# Altium footprint library ThanhNT.PcbLib: 579 footprints (part 6 of 37)
Each footprint in its own frame and in the unit in brackets; x right, y up, seen from the top. Pads: shape width x height; smd on the part's side, far side on the other; paste and mask are expansions set on the pad; w line width, h text height; cw(c..) or ccw(c..) is an arc to the next point about the centre after c.
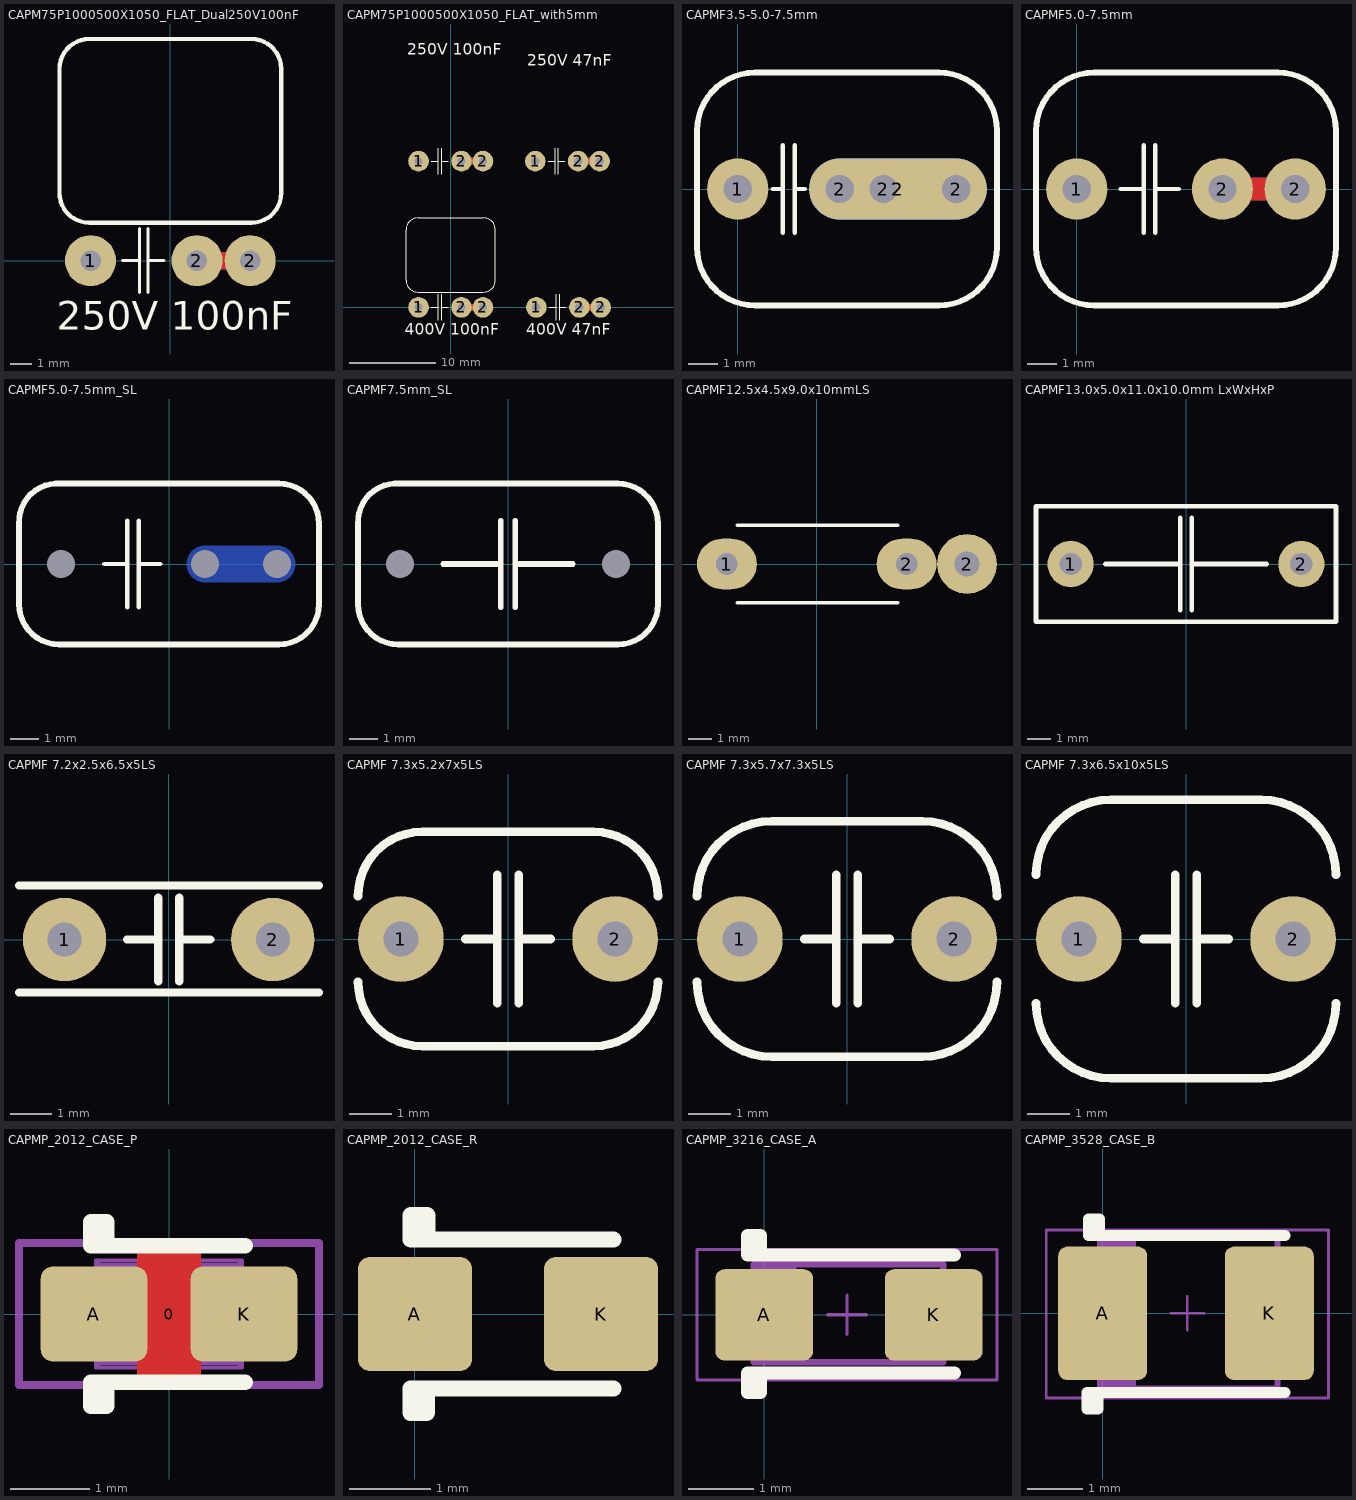
[diagram p5: the footprints below, top view; thin cyan lines are the x and y axes]

## CAPM75P1000500X1050_FLAT_Dual250V100nF [mm] "Capacitor, THT, Metallized Polyester Film with 3.5x9.5x10.0mm TxHxW"
height 3.5
pads (3):
  round 2.4 hole 0.965: 1(-3.75,0) 2(1.25,0) 2(3.75,0)
Top Layer:
  lines w0.813: 1.25,0 3.75,0
Bottom Layer:
  lines w0.813: 1.25,0 3.75,0
Top Overlay:
  lines w0.15: -2.25,0 -1.45,0 ; -1.45,-1.5 -1.45,1.5 ; -1.05,-1.5 -1.05,1.5 ; -1.05,0 -0.3,0
  lines w0.2: -5.207,3.175 ccw(c-3.81,3.175) -3.81,1.778 3.81,1.778 ccw(c3.81,3.175) 5.207,3.175 5.207,9.017 ccw(c3.81,9.017) 3.81,10.414 -3.81,10.414 ccw(c-3.81,9.017) -5.207,9.017 -5.207,3.175
  text "250V 100nF" at -5.334,-3.683 h2.29
3D body "CAPMUC75P900420X810_FLAT.STEP": height 4.2, standoff -1.78, extent -4.5,-0.249 4.5,9.6
3D body "CAPMUC50P650570X860_FLAT.STEP": height 5.7, standoff -1.78, extent -4.5,-0.249 2,10.1
3D body "CAPM50P760540X1040_FLAT.STEP": height 5.4, standoff -1.78, extent -5.05,-0.249 2.55,11.5
3D body "CAPM50P730450X950_FLAT.STEP": height 4.5, standoff -1.78, extent -4.9,-0.249 2.4,10.6
3D body "CAPM75P1000400X850_FLAT.STEP": height 4, standoff -1.78, extent -5,-0.249 5,9.6

## CAPM75P1000500X1050_FLAT_with5mm [mm] "Capacitor, THT, Metallized Polyester Film with 3.5x9.5x10.0mm TxHxW"
height 3.5
pads (12):
  round 2.4 hole 0.965: 1(-3.75,0) 1(-3.75,17.018) 1(9.839,17.018) 1(9.966,0) 2(1.25,0) 2(1.25,17.018) 2(3.75,0) 2(3.75,17.018) 2(14.839,17.018) 2(14.966,0) 2(17.339,17.018) 2(17.466,0)
Top Layer:
  lines w0.813: 1.25,0 3.75,0 ; 1.25,17.018 3.75,17.018 ; 14.839,17.018 17.339,17.018 ; 14.966,0 17.466,0
Bottom Layer:
  lines w0.813: 1.25,0 3.75,0 ; 1.25,17.018 3.75,17.018 ; 14.839,17.018 17.339,17.018 ; 14.966,0 17.466,0
Top Overlay:
  lines w0.127: -2.25,0 -1.45,0 ; -2.25,17.018 -1.45,17.018 ; -1.45,-1.5 -1.45,1.5 ; -1.45,15.518 -1.45,18.518 ; -1.05,-1.5 -1.05,1.5 ; -1.05,0 -0.3,0 ; -1.05,15.518 -1.05,18.518 ; -1.05,17.018 -0.3,17.018 ; 11.339,17.018 12.139,17.018 ; 11.466,0 12.266,0 ; 12.139,15.518 12.139,18.518 ; 12.266,-1.5 12.266,1.5 ; 12.539,15.518 12.539,18.518 ; 12.539,17.018 13.289,17.018 ; 12.666,-1.5 12.666,1.5 ; 12.666,0 13.416,0 ; -5.207,3.175 ccw(c-3.81,3.175) -3.81,1.778 3.81,1.778 ccw(c3.81,3.175) 5.207,3.175 5.207,9.017 ccw(c3.81,9.017) 3.81,10.414 -3.81,10.414 ccw(c-3.81,9.017) -5.207,9.017 -5.207,3.175
  text "400V 100nF" at -5.334,-3.683 h2.29
  text "400V 47nF" at 8.763,-3.683 h2.29
  text "250V 100nF" at -5.08,28.956 h2.29
  text "250V 47nF" at 8.89,27.686 h2.29
3D body "CAPM75P1000400X850_FLAT.STEP": height 4, standoff -1.78, extent -5,16.769 5,26.618
3D body "CAPM50P730450X950_FLAT.STEP": height 4.5, standoff -1.78, extent -4.92,16.769 2.38,27.618
3D body "CAPM50P720350X800_FLAT.STEP": height 3.5, standoff -1.78, extent 8.719,16.769 15.919,26.118
3D body "CAPM75P1000250X700_FLAT.STEP": height 2.5, standoff -1.78, extent 8.589,16.769 18.589,25.118
3D body "CAPM75P1000400X850_FLAT.STEP": height 4, standoff -1.78, extent 8.716,-0.249 18.716,9.6
3D body "CAPM50P730450X950_FLAT.STEP": height 4.5, standoff -1.78, extent 8.796,-0.249 16.096,10.6
3D body "CAPM75P1000500X1050_FLAT.STEP": height 5, standoff -1.78, extent -5,-0.249 5,11.6
3D body "CAPM50P780780X1300_FLAT.STEP": height 7.8, standoff -1.78, extent -5.17,-0.249 2.63,14.1

## CAPMF3.5-5.0-7.5mm [mm] "Capacitor, THT, Metallized Polyester Film, 3.5 & 5.0 & 7.5mm pitch hybrid"
height 10
pads (6):
  round 2.1 hole 0.965: 1(0,0)
  round 1.5 hole 0.965: 2(3.5,0) 2(5,0) 2(7.5,0)
  oval 6.1x2.1 smd: 2(5.5,0)
  oval 6.1x2.1 smd far side: 2(5.5,0)
Top Overlay:
  lines w0.15: 1.2,0 1.55,0 ; 1.55,-1.5 1.55,1.5 ; 1.95,-1.5 1.95,1.5 ; 1.95,0 2.3,0
  lines w0.2: -1.4,-2 ccw(c0.6,-2) 0.6,-4 6.9,-4 ccw(c6.9,-2) 8.9,-2 8.9,2 ccw(c6.9,2) 6.9,4 0.6,4 ccw(c0.6,2) -1.4,2 -1.4,-2
3D body "mfcap_7.5mm 10x8x11mm.stp": height 11, standoff -2.54, extent -1.25,-4 8.75,4

## CAPMF5.0-7.5mm [mm] "Capacitor, THT, Metallized Polyester Film, 5 & 7.5mm pitch hybrid"
height 10
pads (3):
  round 2.1 hole 0.965: 1(0,0) 2(5,0) 2(7.5,0)
Top Layer:
  lines w0.8: 5,0 7.5,0
Bottom Layer:
  lines w0.8: 5,0 7.5,0
Top Overlay:
  lines w0.15: 1.5,0 2.3,0 ; 2.3,-1.5 2.3,1.5 ; 2.7,-1.5 2.7,1.5 ; 2.7,0 3.5,0
  lines w0.2: -1.4,-2 ccw(c0.6,-2) 0.6,-4 6.9,-4 ccw(c6.9,-2) 8.9,-2 8.9,2 ccw(c6.9,2) 6.9,4 0.6,4 ccw(c0.6,2) -1.4,2 -1.4,-2
3D body "mfcap_7.5mm 10x8x11mm.stp": height 11, standoff -2.54, extent -1.25,-4 8.75,4

## CAPMF5.0-7.5mm_SL [mm] "Capacitor, THT, Metallized Polyester Film"
height 9
pads (3):
  round 0 / inner round 0 / far side round 2.4 hole 0.965 unplated: 1(-3.75,0) 2(1.25,0) 2(3.75,0)
Bottom Layer:
  lines w1.27: 1.25,0 3.75,0
Top Overlay:
  lines w0.15: -2.25,0 -1.45,0 ; -1.45,-1.5 -1.45,1.5 ; -1.05,-1.5 -1.05,1.5 ; -1.05,0 -0.3,0
  lines w0.2: -5.207,-1.397 ccw(c-3.81,-1.397) -3.81,-2.794 3.81,-2.794 ccw(c3.81,-1.397) 5.207,-1.397 5.207,1.397 ccw(c3.81,1.397) 3.81,2.794 -3.937,2.794 ccw(c-3.873,1.46) -5.207,1.397 -5.207,-1.397
3D body "CAPF_6.0x9.0x10.5 TxHxW 7.5mmLS.STEP": height 9, standoff -2.54, extent -5.25,-3 5.25,3

## CAPMF7.5mm_SL [mm] "Capacitor, THT, Metallized Polyester Film"
height 9
pads (2):
  round 0 / inner round 0 / far side round 2.4 hole 0.965 unplated: 1(-3.75,0) 2(3.75,0)
Top Overlay:
  lines w0.2: -2.25,0 -0.25,0 ; -0.25,-1.5 -0.25,1.5 ; 0.25,-1.5 0.25,1.5 ; 0.25,0 2.25,0 ; -5.207,-1.397 ccw(c-3.81,-1.397) -3.81,-2.794 3.81,-2.794 ccw(c3.81,-1.397) 5.207,-1.397 5.207,1.397 ccw(c3.81,1.397) 3.81,2.794 -3.937,2.794 ccw(c-3.873,1.46) -5.207,1.397 -5.207,-1.397
3D body "CAPF_5.5x9.0x10.0 TxHxW 7.5mmLS.STEP": height 9, standoff -2.54, extent -5,-2.75 5,2.75

## CAPMF12.5x4.5x9.0x10mmLS [mil] "Capacitor, MF, Thru-Hole, Dipped Radial; Body 12.5 x 4.5 x 9.0 mm (WxTxH) Pin Spacing 10.0 mm (typ)"
height 354.33
pads (3):
  oval 100x85 hole 36: 1(-150,0) 2(150,0)
  round 100 hole 42: 2(251,0)
Top Overlay:
  lines w6: -132.72,-65 135,-65 ; -132.72,65 135,65
3D body "CAPMF_12.5x4.5x8mm LxTxH 10mmLS.STEP": height 354.33, standoff -100, extent -196.06,-88.58 296.07,88.59

## CAPMF13.0x5.0x11.0x10.0mm LxWxHxP [mm] "Capacitor, THT, Metallized Polypropylene Film, 10mm lead pitch"
height 11
pads (2):
  round 2 hole 0.965: 1(-5,0) 2(5,0)
Top Overlay:
  lines w0.2: -3.5,0 -0.25,0 ; -0.25,-2 -0.25,2 ; 0.25,-2 0.25,2 ; 0.25,0 3.5,0 ; -6.5,-2.5 -6.5,2.5 6.5,2.5 6.5,-2.5 -6.5,-2.5
3D body: height 11, standoff 0, extent -6.5,-2.5 6.5,2.5

## CAPMF 7.2x2.5x6.5x5LS [mm] "Capacitor, THT, Metallized Polyester Film"
height 8.2
pads (2):
  round 2 hole 0.813: 1(-2.5,0) 2(2.5,0)
Top Overlay:
  lines w0.2: -3.593,-1.27 3.607,-1.27 ; -3.593,1.295 3.607,1.295 ; -1,0 -0.25,0 ; -0.25,-1 -0.25,1 ; 0.25,-1 0.25,1 ; 0.25,0 1,0
3D body "Cap, film, 7.2x2.5x6.5x5LS.STEP": height 7.5, standoff -2, extent -3.6,-1.25 3.6,1.25

## CAPMF 7.3x5.2x7x5LS [mm] "Capacitor, THT, Metallized Polyester Film"
height 7
pads (2):
  round 2 hole 0.813: 1(-2.5,0) 2(2.5,0)
Top Overlay:
  lines w0.2: -3.5,-1 ccw(c-2,-1) -2,-2.5 2,-2.5 ccw(c2,-1) 3.5,-1 ; -3.5,1 cw(c-2,1) -2,2.5 2,2.5 cw(c2,1) 3.5,1 ; -1,0 -0.25,0 ; -0.25,-1.5 -0.25,1.5 ; 0.25,-1.5 0.25,1.5 ; 0.25,0 1,0
3D body "Cap, film, 7.3x5.2x7x5LS.STP": height 8, standoff -2, extent -3.65,-2.6 3.65,2.6

## CAPMF 7.3x5.7x7.3x5LS [mm] "Capacitor, THT, Metallized Polyester Film"
height 7
pads (2):
  round 2 hole 0.813: 1(-2.5,0) 2(2.5,0)
Top Overlay:
  lines w0.2: -3.5,-1 ccw(c-1.75,-1) -1.75,-2.75 1.75,-2.75 ccw(c1.75,-1) 3.5,-1 ; -3.5,1 cw(c-1.75,1) -1.75,2.75 1.75,2.75 cw(c1.75,1) 3.5,1 ; -1,0 -0.25,0 ; -0.25,-1.5 -0.25,1.5 ; 0.25,-1.5 0.25,1.5 ; 0.25,0 1,0
3D body "Cap, film, 7.3x5.7x7.3x5LS.STP": height 8.3, standoff -2, extent -3.65,-2.85 3.65,2.85

## CAPMF 7.3x6.5x10x5LS [mm] "Capacitor, THT, Metallized Polyester Film"
height 10
pads (2):
  round 2 hole 0.813: 1(-2.5,0) 2(2.5,0)
Top Overlay:
  lines w0.2: -3.5,-1.5 ccw(c-1.75,-1.5) -1.75,-3.25 1.75,-3.25 ccw(c1.75,-1.5) 3.5,-1.5 ; -3.5,1.5 cw(c-1.75,1.5) -1.75,3.25 1.75,3.25 cw(c1.75,1.5) 3.5,1.5 ; -1,0 -0.25,0 ; -0.25,-1.5 -0.25,1.5 ; 0.25,-1.5 0.25,1.5 ; 0.25,0 1,0
3D body "Cap, film, 7.3x6.5x10x5LS.STP": height 11, standoff -2, extent -3.65,-3.25 3.65,3.25

## CAPMP_2012_CASE_P [mm] "Tatalum Capacitor SMD (2012_0805), Molded body capacitor"
height 1.2
pads (3):
  round 0.254 on Mech15: 0(0,0)
  rrect25% 1.35x1.2 smd: A(-0.95,0) K(0.95,0)
Top Layer:
  pour cut-out: -0.4,0.8 0.4,0.8 0.4,-0.8 -0.4,-0.8
Top Overlay:
  lines w0.2: -0.89,-1.164 -0.89,-0.864 ; -0.887,0.864 -0.887,1.164 ; -0.79,-0.864 -0.79,-1.164 -0.99,-1.164 -0.99,-0.864 0.965,-0.864 ; -0.787,0.864 -0.787,1.164 -0.987,1.164 -0.987,0.864 0.965,0.864
Mechanical 13:
  lines w0.05: -1.025,-0.25 -0.925,-0.25 ; -1.025,0.25 -0.925,0.25 ; -0.925,-0.5 -1.025,-0.5 -1.025,0.5 -0.925,0.5 ; -0.373,-0.623 -0.373,0.623 ; 0.925,-0.5 1.025,-0.5 1.025,0.5 0.925,0.5 ; 0.925,-0.25 1.025,-0.25 ; 0.925,0.25 1.025,0.25 ; -0.925,-0.675 -0.873,-0.623 ; -0.925,-0.675 -0.925,0.675 ; -0.925,-0.675 0.925,-0.675 ; -0.925,0.675 -0.873,0.623 ; -0.925,0.675 0.925,0.675 ; -0.873,-0.623 -0.873,0.623 ; -0.873,-0.623 0.873,-0.623 ; -0.873,0.623 0.873,0.623 ; 0.873,-0.623 0.873,0.623 ; 0.873,-0.623 0.925,-0.675 ; 0.873,0.623 0.925,0.675 ; 0.925,-0.675 0.925,0.675
Mechanical 15:
  lines w0.1: -1.9,-0.9 -1.9,0.9 1.9,0.9 1.9,-0.9 -1.9,-0.9
3D body "CAPMP2012X150N.STEP": height 1.5, standoff 0, extent -1.025,-0.675 1.025,0.675

## CAPMP_2012_CASE_R [mm] "Tatalum Capacitor SMD (2012_0805), Molded body capacitor"
pads (2):
  rrect20% 1.4x1.4 smd: A(0,0) K(2.286,0)
Top Overlay:
  lines w0.2: 0.046,-1.214 0.046,-0.914 ; 0.049,0.914 0.049,1.214 ; 0.146,-0.914 0.146,-1.214 -0.054,-1.214 -0.054,-0.914 2.438,-0.914 ; 0.149,0.914 0.149,1.214 -0.051,1.214 -0.051,0.914 2.438,0.914
3D body "User Library-CaseR_2012-12.STEP": height 1.2, standoff 0, extent 0.143,-0.65 2.143,0.65

## CAPMP_3216_CASE_A [mm] "Tatalum Capacitor SMD (3216_1206), Molded body capacitor"
height 1.6
pads (2):
  rrect20% 1.5x1.4 smd: A(0,0) K(2.6,0)
Top Overlay:
  lines w0.2: -0.157,-1.189 -0.157,-0.889 ; -0.154,0.914 -0.154,1.214 ; -0.057,-0.889 -0.057,-1.189 -0.257,-1.189 -0.257,-0.889 2.921,-0.889 ; -0.054,0.914 -0.054,1.214 -0.254,1.214 -0.254,0.914 2.921,0.914
Mechanical 15:
  lines w0.05: 0.97,0 1.57,0 ; 1.27,-0.3 1.27,0.3 ; -1.03,-1 3.57,-1 3.57,1 -1.03,1 -1.03,-1
Mechanical 16:
  rectangle: -0.156,-0.725 0.494,0.775
  region: 2.894,0.625 2.694,0.625 2.694,-0.575 2.894,-0.575
  rectangle: -0.306,-0.575 -0.106,0.625
  lines w0.102: -0.156,-0.725 -0.156,0.775 2.744,0.775 2.744,-0.725 -0.156,-0.725
3D body "User Library-CaseA_3216-18.STEP": height 1.6, standoff 0, extent -0.304,-0.8 2.896,0.8

## CAPMP_3528_CASE_B [mm] "Tatalum Capacitor SMD (3528_1411), Molded body capacitor"
height 1.9
pads (2):
  rrect20% 1.6x2.4 smd: A(0,0) K(3,0)
Top Overlay:
  lines w0.2: -0.182,-1.722 -0.182,-1.422 ; -0.154,1.397 -0.154,1.697 ; -0.082,-1.422 -0.082,-1.722 -0.282,-1.722 -0.282,-1.422 3.277,-1.422 ; -0.054,1.397 -0.054,1.697 -0.254,1.697 -0.254,1.397 3.277,1.397
Mechanical 15:
  lines w0.05: 1.224,0 1.824,0 ; 1.524,-0.3 1.524,0.3 ; -1.016,-1.524 4.064,-1.524 4.064,1.499 -1.016,1.499 -1.016,-1.524
Mechanical 16:
  rectangle: -0.202,-1.1 -0.002,1.1
  region: 3.298,1.1 3.098,1.1 3.098,-1.1 3.298,-1.1
  rectangle: -0.052,-1.35 0.598,1.35
  lines w0.102: -0.052,-1.35 3.148,-1.35 3.148,1.35 -0.052,1.35 -0.052,-1.35
3D body "User Library-CaseB_3528-21.STEP": height 1.9, standoff 0, extent -0.251,-1.4 3.249,1.4